# Altium footprint library 6-Connectors-4.PcbLib: 166 footprints (part 4 of 12) (continued)
## MOLEX_87832-1420 [mm] "Milli-Grid, Pitch 2mm, 14 contacts, Surface Mount Vertical Header With Locking Window And Centre Polarization Slot"
height 6.4
pads (16):
  rect 1x2.75 smd: 1(-6,-2.125) 2(-6,2.125) 3(-4,-2.125) 4(-4,2.125) 5(-2,-2.125) 6(-2,2.125) 7(0,-2.125) 8(0,2.125) 9(2,-2.125) 10(2,2.125) 11(4,-2.125) 12(4,2.125) 13(6,-2.125) 14(6,2.125)
  round 0.5 hole 1 unplated: 15(-5,0) 16(5,0)
Top Overlay:
  lines w0.2: -8.325,-1.5 -7.675,-1.5 ; -8.325,0.5 -7.675,0.5 ; -6.8,-3.15 -8.325,-3.15 ; -6.8,-2.5 -7.675,-2.5 ; -6.8,2.5 -7.675,2.5 ; -6.8,3.15 -8.325,3.15 ; 6.8,-3.15 8.325,-3.15 ; 6.8,-2.5 7.675,-2.5 ; 6.8,2.5 7.675,2.5 ; 6.8,3.15 8.325,3.15 ; 7.675,-0.5 8.325,-0.5 ; 7.675,1.5 8.325,1.5 ; -8.325,-3.15 -7.675,-2.5 ; -8.325,-3.15 -8.325,3.15 ; -8.325,3.15 -7.675,2.5 ; -7.675,-2.5 -7.675,2.5 ; 7.675,-2.5 7.675,2.5 ; 7.675,-2.5 8.325,-3.15 ; 7.675,-2.5 8.325,-3.15 ; 7.675,2.5 8.325,3.15 ; 7.675,2.5 8.325,3.15 ; 8.325,-3.15 8.325,3.15 ; -6.5,-4.25 -5.5,-4.25 -6,-3.75 -6.5,-4.25
Mechanical 14:
  lines w0.1: -8.325,-1.5 -7.675,-1.5 ; -8.325,0.5 -7.675,0.5 ; 7.675,-0.5 8.325,-0.5 ; 7.675,1.5 8.325,1.5 ; -8.325,-3.15 -8.325,3.15 ; -8.325,-3.15 -7.675,-2.5 ; -8.325,-3.15 8.325,-3.15 ; -8.325,3.15 -7.675,2.5 ; -8.325,3.15 8.325,3.15 ; -7.675,-2.5 7.675,-2.5 ; -7.675,-2.5 -7.675,2.5 ; -7.675,2.5 7.675,2.5 ; 7.675,-2.5 8.325,-3.15 ; 7.675,-2.5 8.325,-3.15 ; 7.675,-2.5 7.675,2.5 ; 7.675,2.5 8.325,3.15 ; 7.675,2.5 8.325,3.15 ; 8.325,-3.15 8.325,3.15 ; -6.5,-4.25 -6,-3.75 -5.5,-4.25 -6.5,-4.25
Mechanical 15:
  lines w0.05: -8.575,-3.765 8.575,-3.765 8.575,3.765 -8.575,3.765 -8.575,-3.765
3D body "MOLEX_87832-1420.stp": height 7.6, standoff -1, extent -8.325,-3.15 8.325,3.15
3D body "p275-100.stp": height 0.02, standoff 0, extent -6.5,0.75 -5.5,3.5
3D body "p275-100.stp": height 0.02, standoff 0, extent -4.5,0.75 -3.5,3.5
3D body "p275-100.stp": height 0.02, standoff 0, extent -2.5,0.75 -1.5,3.5
3D body "p275-100.stp": height 0.02, standoff 0, extent -6.5,-3.5 -5.5,-0.75
3D body "p275-100.stp": height 0.02, standoff 0, extent -4.5,-3.5 -3.5,-0.75
3D body "p275-100.stp": height 0.02, standoff 0, extent -4.5,0.75 -3.5,3.5
3D body "p275-100.stp": height 0.02, standoff 0, extent -2.5,-3.5 -1.5,-0.75
3D body "p275-100.stp": height 0.02, standoff 0, extent -2.5,0.75 -1.5,3.5
3D body "p275-100.stp": height 0.02, standoff 0, extent -0.5,-3.5 0.5,-0.75
3D body "p275-100.stp": height 0.02, standoff 0, extent -0.5,0.75 0.5,3.5
3D body "p275-100.stp": height 0.02, standoff 0, extent 1.5,-3.5 2.5,-0.75
3D body "p275-100.stp": height 0.02, standoff 0, extent 1.5,0.75 2.5,3.5
3D body "p275-100.stp": height 0.02, standoff 0, extent 3.5,-3.5 4.5,-0.75
3D body "p275-100.stp": height 0.02, standoff 0, extent 3.5,0.75 4.5,3.5
3D body "p275-100.stp": height 0.02, standoff 0, extent 5.5,-3.5 6.5,-0.75
3D body "p275-100.stp": height 0.02, standoff 0, extent 5.5,0.75 6.5,3.5

## MOLEX_87833-1420 [mm] "2.00mm (.079\") Pitch Milli-Grid?Header, Right Angle, Shrouded, Center Polarization Slot, Locking Window, 14 Circuits"
height 6.4
pads (14):
  round 1.6 hole 0.9: 1(-6,-1) 2(-6,1) 3(-4,-1) 4(-4,1) 5(-2,-1) 6(-2,1) 7(0,-1) 8(0,1) 9(2,-1) 10(2,1) 11(4,-1) 12(4,1) 13(6,-1) 14(6,1)
Top Overlay:
  lines w0.2: -7.5,2.7 -7.5,1 -7.1,1 ; -6.325,7.4 -5.825,6.534 -5.325,7.4 ; -5.5,2.7 -5.3,5.3 -4.95,5.3 -4.95,4.7 -3.05,4.7 -3.05,5.3 -2.7,5.3 -2.5,2.7 ; -1.8,7.4 cw(c-1.8,6.8) -1.2,6.8 -1.2,3.65 1.2,3.65 1.2,6.8 cw(c1.8,6.8) 1.8,7.4 ; -0.25,3.65 -0.25,6.65 ; 0.25,3.65 0.25,6.65 ; 2.5,2.7 2.7,5.3 3.05,5.3 3.05,4.7 4.95,4.7 4.95,5.3 5.3,5.3 5.5,2.7 ; 7.1,1 7.5,1 7.5,2.7 ; -0.25,6.65 0.25,6.65 ; -0.25,6.65 -0.1,7.25 0.1,7.25 0.25,6.65 ; -8.325,2.7 8.325,2.7 8.325,7.4 -8.325,7.4 -8.325,2.7
Mechanical 8:
  lines w0.1: -6.5,-1 -6,-1 ; -6.5,1 -6,1 ; -6,-0.5 -6,-1 ; -6,0.5 -6,1 ; -6,1.5 -6,1 ; -5.5,-1 -6,-1 ; -5.5,1 -6,1 ; -4.5,-1 -4,-1 ; -4.5,1 -4,1 ; -4,-0.5 -4,-1 ; -4,0.5 -4,1 ; -4,1.5 -4,1 ; -3.5,-1 -4,-1 ; -3.5,1 -4,1 ; -2.5,-1 -2,-1 ; -2.5,1 -2,1 ; -2,-0.5 -2,-1 ; -2,0.5 -2,1 ; -2,1.5 -2,1 ; -1.5,-1 -2,-1 ; -1.5,1 -2,1 ; -0.5,-1 0,-1 ; -0.5,1 0,1 ; 0,-0.5 0,-1 ; 0,0.5 0,1 ; 0,1.5 0,1 ; 0.5,-1 0,-1 ; 0.5,1 0,1 ; 1.5,-1 2,-1 ; 1.5,1 2,1 ; 2,-0.5 2,-1 ; 2,0.5 2,1 ; 2,1.5 2,1 ; 2.5,-1 2,-1 ; 2.5,1 2,1 ; 3.5,-1 4,-1 ; 3.5,1 4,1 ; 4,-0.5 4,-1 ; 4,0.5 4,1 ; 4,1.5 4,1 ; 4.5,-1 4,-1 ; 4.5,1 4,1 ; 5.5,-1 6,-1 ; 5.5,1 6,1 ; 6,-0.5 6,-1 ; 6,0.5 6,1 ; 6,1.5 6,1 ; 6.5,-1 6,-1 ; 6.5,1 6,1 ; -6,-1 -6,-1.5 -6,-1 ; -4,-1 -4,-1.5 -4,-1 ; -2,-1 -2,-1.5 -2,-1 ; 0,-1 0,-1.5 0,-1 ; 2,-1 2,-1.5 2,-1 ; 4,-1 4,-1.5 4,-1 ; 6,-1 6,-1.5 6,-1
Mechanical 14:
  lines w0.1: -7.5,2.7 -7.5,1 -6.65,1 -6.65,1.85 -5.35,1.85 -5.35,1 -4.65,1 -4.65,1.85 -3.35,1.85 -3.35,1 -2.65,1 -2.65,1.85 -1.35,1.85 -1.35,1 -0.65,1 -0.65,1.85 0.65,1.85 0.65,1 1.35,1 1.35,1.85 2.65,1.85 2.65,1 3.35,1 3.35,1.85 4.65,1.85 4.65,1 5.35,1 5.35,1.85 6.65,1.85 6.65,1 7.5,1 7.5,2.7 ; -6.65,1.35 -5.35,1.35 ; -6.325,7.4 -5.825,6.534 -5.325,7.4 ; -6.25,1.35 -6.25,-1.25 -5.75,-1.25 -5.75,1.35 ; -5.5,2.7 -5.3,5.3 -4.95,5.3 -4.95,4.7 -3.05,4.7 -3.05,5.3 -2.7,5.3 -2.5,2.7 ; -5.427,3.65 -3.4,3.65 -3.4,4.7 ; -4.65,1.35 -3.35,1.35 ; -4.4,3.65 -4.4,4.7 ; -4.25,1.35 -4.25,-1.25 -3.75,-1.25 -3.75,1.35 ; -4.25,3.65 -4.25,4.7 ; -3.75,3.65 -3.75,4.7 ; -3.6,3.65 -3.6,4.7 ; -2.65,1.35 -1.35,1.35 ; -2.25,1.35 -2.25,-1.25 -1.75,-1.25 -1.75,1.35 ; -1.8,7.4 cw(c-1.8,6.8) -1.2,6.8 -1.2,3.65 1.2,3.65 1.2,6.8 cw(c1.8,6.8) 1.8,7.4 ; -1.255,7.05 -0.4,7.05 -0.4,3.65 ; -0.4,6.8 -0.212,6.8 ; -0.25,1.35 -0.25,-1.25 0.25,-1.25 0.25,1.35 ; -0.25,3.65 -0.25,6.65 ; 0.212,6.8 0.4,6.8 ; 0.25,3.65 0.25,6.65 ; 0.4,3.65 0.4,7.05 1.255,7.05 ; 1.35,1.35 2.65,1.35 ; 1.75,1.35 1.75,-1.25 2.25,-1.25 2.25,1.35 ; 2.5,2.7 2.7,5.3 3.05,5.3 3.05,4.7 4.95,4.7 4.95,5.3 5.3,5.3 5.5,2.7 ; 3.35,1.35 4.65,1.35 ; 3.4,4.7 3.4,3.65 5.427,3.65 ; 3.6,3.65 3.6,4.7 ; 3.75,1.35 3.75,-1.25 4.25,-1.25 4.25,1.35 ; 3.75,3.65 3.75,4.7 ; 4.25,3.65 4.25,4.7 ; 4.4,3.65 4.4,4.7 ; 5.35,1.35 6.65,1.35 ; 5.75,1.35 5.75,-1.25 6.25,-1.25 6.25,1.35 ; -0.25,6.65 0.25,6.65 ; -0.25,6.65 -0.1,7.25 0.1,7.25 0.25,6.65 ; -8.325,2.7 8.325,2.7 8.325,7.4 -8.325,7.4 -8.325,2.7 ; -0.65,1.35 0.65,1.35 -0.65,1.35
3D body "MOLEX_87833-1420.stp": height 6.3, standoff -2.16, extent -8.325,-1.25 8.325,7.4
3D body "v160-080.stp": height 0.02, standoff -1.65, extent -6.8,0.2 -5.2,1.8
3D body "v160-080.stp": height 0.02, standoff -1.65, extent -6.8,-1.8 -5.2,-0.2
3D body "v160-080.stp": height 0.02, standoff -1.65, extent -4.8,0.2 -3.2,1.8
3D body "v160-080.stp": height 0.02, standoff -1.65, extent -4.8,-1.8 -3.2,-0.2
3D body "v160-080.stp": height 0.02, standoff -1.65, extent -2.8,0.2 -1.2,1.8
3D body "v160-080.stp": height 0.02, standoff -1.65, extent -2.8,-1.8 -1.2,-0.2
3D body "v160-080.stp": height 0.02, standoff -1.65, extent -0.8,-1.8 0.8,-0.2
3D body "v160-080.stp": height 0.02, standoff -1.65, extent -0.8,0.2 0.8,1.8
3D body "v160-080.stp": height 0.02, standoff -1.65, extent 1.2,0.2 2.8,1.8
3D body "v160-080.stp": height 0.02, standoff -1.65, extent 1.2,-1.8 2.8,-0.2
3D body "v160-080.stp": height 0.02, standoff -1.65, extent 3.2,-1.8 4.8,-0.2
3D body "v160-080.stp": height 0.02, standoff -1.65, extent 3.2,0.2 4.8,1.8
3D body "v160-080.stp": height 0.02, standoff -1.65, extent 5.2,0.2 6.8,1.8
3D body "v160-080.stp": height 0.02, standoff -1.65, extent 5.2,-1.8 6.8,-0.2

## MOLEX_90121-0772 [mm] "2.54mm (.100\") Pitch, 12 Circuits  Single Row  Right Angle C-Grid III Header"
height 3.6
pads (12):
  round 1.7 hole 1: 1(-13.97,0) 2(-11.43,0) 3(-8.89,0) 4(-6.35,0) 5(-3.81,0) 6(-1.27,0) 7(1.27,0) 8(3.81,0) 9(6.35,0) 10(8.89,0) 11(11.43,0) 12(13.97,0)
Top Overlay:
  circle w0.5: c-15.825,0.85 r0.25
  lines w0.2: -15.117,2.25 -15.117,1.75 ; -15.115,2.25 -15.117,1.75 ; -14.288,1.209 -14.288,2.25 ; -14.288,1.75 -15.117,1.75 ; -14.288,4.25 -14.288,11 -13.653,11 -13.653,4.25 ; -13.653,1.209 -13.653,2.25 ; -13.653,1.75 -12.823,1.75 -12.823,2.25 ; -12.577,2.25 -12.577,1.75 -11.748,1.75 ; -11.748,1.209 -11.748,2.25 ; -11.748,4.25 -11.748,11 -11.113,11 -11.113,4.25 ; -11.113,1.209 -11.113,2.25 ; -11.113,1.75 -10.283,1.75 -10.283,2.25 ; -10.037,2.25 -10.037,1.75 -9.208,1.75 ; -9.208,1.209 -9.208,2.25 ; -9.208,4.25 -9.208,11 -8.573,11 -8.573,4.25 ; -8.573,1.209 -8.573,2.25 ; -8.573,1.75 -7.743,1.75 -7.743,2.25 ; -7.497,2.25 -7.497,1.75 -6.668,1.75 ; -6.668,1.209 -6.668,2.25 ; -6.668,4.25 -6.668,11 -6.033,11 -6.033,4.25 ; -6.033,1.209 -6.033,2.25 ; -6.033,1.75 -5.203,1.75 -5.203,2.25 ; -4.957,2.25 -4.957,1.75 -4.128,1.75 ; -4.128,1.209 -4.128,2.25 ; -4.128,4.25 -4.128,11 -3.493,11 -3.493,4.25 ; -3.493,1.209 -3.493,2.25 ; -3.493,1.75 -2.663,1.75 -2.663,2.25 ; -2.417,2.25 -2.417,1.75 -1.587,1.75 ; -1.587,1.209 -1.587,2.25 ; -1.587,4.25 -1.587,11 -0.953,11 -0.953,4.25 ; -0.953,1.209 -0.953,2.25 ; -0.953,1.75 -0.123,1.75 -0.123,2.25 ; 0.123,2.25 0.123,1.75 0.953,1.75 ; 0.953,1.209 0.953,2.25 ; 0.953,4.25 0.953,11 1.587,11 1.587,4.25 ; 1.587,1.209 1.587,2.25 ; 1.587,1.75 2.417,1.75 2.417,2.25 ; 2.663,2.25 2.663,1.75 3.493,1.75 ; 3.493,1.209 3.493,2.25 ; 3.493,4.25 3.493,11 4.128,11 4.128,4.25 ; 4.128,1.209 4.128,2.25 ; 4.128,1.75 4.957,1.75 4.957,2.25 ; 5.203,2.25 5.203,1.75 6.033,1.75 ; 6.033,1.209 6.033,2.25 ; 6.033,4.25 6.033,11 6.668,11 6.668,4.25 ; 6.668,1.209 6.668,2.25 ; 6.668,1.75 7.497,1.75 7.497,2.25 ; 7.743,2.25 7.743,1.75 8.573,1.75 ; 8.573,1.209 8.573,2.25 ; 8.573,4.25 8.573,11 9.208,11 9.208,4.25 ; 9.208,1.209 9.208,2.25 ; 9.208,1.75 10.037,1.75 10.037,2.25 ; 10.283,2.25 10.283,1.75 11.113,1.75 ; 11.113,1.209 11.113,2.25 ; 11.113,4.25 11.113,11 11.748,11 11.748,4.25 ; 11.748,1.209 11.748,2.25 ; 11.748,1.75 12.577,1.75 12.577,2.25 ; 12.823,2.25 12.823,1.75 13.653,1.75 ; 13.653,1.209 13.653,2.25 ; 13.653,4.25 13.653,11 14.288,11 14.288,4.25 ; 14.288,1.209 14.288,2.25 ; 14.288,1.75 15.12,1.75 ; 15.117,1.75 15.117,2.25 ; -15.24,2.25 -15.24,4.25 15.24,4.25 15.24,2.25 -15.24,2.25
Mechanical 8:
  lines w0.1: -14.47,0 -13.97,0 ; -13.97,-0.5 -13.97,0 ; -13.97,0.5 -13.97,0 ; -13.47,0 -13.97,0 ; -11.93,0 -11.43,0 ; -11.43,-0.5 -11.43,0 ; -11.43,0.5 -11.43,0 ; -10.93,0 -11.43,0 ; -9.39,0 -8.89,0 ; -8.89,-0.5 -8.89,0 ; -8.89,0.5 -8.89,0 ; -8.39,0 -8.89,0 ; -6.85,0 -6.35,0 ; -6.35,-0.5 -6.35,0 ; -6.35,0.5 -6.35,0 ; -5.85,0 -6.35,0 ; -4.31,0 -3.81,0 ; -3.81,-0.5 -3.81,0 ; -3.81,0.5 -3.81,0 ; -3.31,0 -3.81,0 ; -1.77,0 -1.27,0 ; -1.27,-0.5 -1.27,0 ; -1.27,0.5 -1.27,0 ; -0.77,0 -1.27,0 ; -0.5,0 0,0 ; 0,-0.5 0,0 ; 0,0.5 0,0 ; 0.5,0 0,0 ; 0.77,0 1.27,0 ; 1.27,-0.5 1.27,0 ; 1.27,0.5 1.27,0 ; 1.77,0 1.27,0 ; 3.31,0 3.81,0 ; 3.81,-0.5 3.81,0 ; 3.81,0.5 3.81,0 ; 4.31,0 3.81,0 ; 5.85,0 6.35,0 ; 6.35,-0.5 6.35,0 ; 6.35,0.5 6.35,0 ; 6.85,0 6.35,0 ; 8.39,0 8.89,0 ; 8.89,-0.5 8.89,0 ; 8.89,0.5 8.89,0 ; 9.39,0 8.89,0 ; 10.93,0 11.43,0 ; 11.43,-0.5 11.43,0 ; 11.43,0.5 11.43,0 ; 11.93,0 11.43,0 ; 13.47,0 13.97,0 ; 13.97,-0.5 13.97,0 ; 13.97,0.5 13.97,0 ; 14.47,0 13.97,0
Mechanical 14:
  circle w0.5: c-15.825,0.85 r0.25
  lines w0.1: -15.117,2.25 -15.117,1.75 ; -15.115,2.25 -15.117,1.75 ; -14.288,1.75 -15.117,1.75 ; -14.288,2.25 -14.288,-0.318 -13.653,-0.318 -13.653,2.25 ; -14.288,4.25 -14.288,11 -13.653,11 -13.653,4.25 ; -13.653,1.75 -12.823,1.75 -12.823,2.25 ; -12.577,2.25 -12.577,1.75 -11.748,1.75 ; -11.748,2.25 -11.748,-0.318 -11.113,-0.318 -11.113,2.25 ; -11.748,4.25 -11.748,11 -11.113,11 -11.113,4.25 ; -11.113,1.75 -10.283,1.75 -10.283,2.25 ; -10.037,2.25 -10.037,1.75 -9.208,1.75 ; -9.208,2.25 -9.208,-0.318 -8.573,-0.318 -8.573,2.25 ; -9.208,4.25 -9.208,11 -8.573,11 -8.573,4.25 ; -8.573,1.75 -7.743,1.75 -7.743,2.25 ; -7.497,2.25 -7.497,1.75 -6.668,1.75 ; -6.668,2.25 -6.668,-0.318 -6.033,-0.318 -6.033,2.25 ; -6.668,4.25 -6.668,11 -6.033,11 -6.033,4.25 ; -6.033,1.75 -5.203,1.75 -5.203,2.25 ; -4.957,2.25 -4.957,1.75 -4.128,1.75 ; -4.128,2.25 -4.128,-0.318 -3.493,-0.318 -3.493,2.25 ; -4.128,4.25 -4.128,11 -3.493,11 -3.493,4.25 ; -3.493,1.75 -2.663,1.75 -2.663,2.25 ; -2.417,2.25 -2.417,1.75 -1.587,1.75 ; -1.587,2.25 -1.587,-0.318 -0.953,-0.318 -0.953,2.25 ; -1.587,4.25 -1.587,11 -0.953,11 -0.953,4.25 ; -0.953,1.75 -0.123,1.75 -0.123,2.25 ; 0.123,2.25 0.123,1.75 0.953,1.75 ; 0.953,2.25 0.953,-0.318 1.587,-0.318 1.587,2.25 ; 0.953,4.25 0.953,11 1.587,11 1.587,4.25 ; 1.587,1.75 2.417,1.75 2.417,2.25 ; 2.663,2.25 2.663,1.75 3.493,1.75 ; 3.493,2.25 3.493,-0.318 4.128,-0.318 4.128,2.25 ; 3.493,4.25 3.493,11 4.128,11 4.128,4.25 ; 4.128,1.75 4.957,1.75 4.957,2.25 ; 5.203,2.25 5.203,1.75 6.033,1.75 ; 6.033,2.25 6.033,-0.318 6.668,-0.318 6.668,2.25 ; 6.033,4.25 6.033,11 6.668,11 6.668,4.25 ; 6.668,1.75 7.497,1.75 7.497,2.25 ; 7.743,2.25 7.743,1.75 8.573,1.75 ; 8.573,2.25 8.573,-0.318 9.208,-0.318 9.208,2.25 ; 8.573,4.25 8.573,11 9.208,11 9.208,4.25 ; 9.208,1.75 10.037,1.75 10.037,2.25 ; 10.283,2.25 10.283,1.75 11.113,1.75 ; 11.113,2.25 11.113,-0.318 11.748,-0.318 11.748,2.25 ; 11.113,4.25 11.113,11 11.748,11 11.748,4.25 ; 11.748,1.75 12.577,1.75 12.577,2.25 ; 12.823,2.25 12.823,1.75 13.653,1.75 ; 13.653,2.25 13.653,-0.318 14.288,-0.318 14.288,2.25 ; 13.653,4.25 13.653,11 14.288,11 14.288,4.25 ; 14.288,1.75 15.12,1.75 ; 15.117,1.75 15.117,2.25 ; -15.24,2.25 -15.24,4.25 15.24,4.25 15.24,2.25 -15.24,2.25
3D body "MOLEX_90121-0772.stp": height 3.6, standoff -2.9, extent -15.24,-0.317 15.24,11
3D body "v160-080.stp": height 0.02, standoff -1.65, extent -14.77,-0.8 -13.17,0.8
3D body "v160-080.stp": height 0.02, standoff -1.65, extent -12.23,-0.8 -10.63,0.8
3D body "v160-080.stp": height 0.02, standoff -1.65, extent -9.69,-0.8 -8.09,0.8
3D body "v160-080.stp": height 0.02, standoff -1.65, extent -7.15,-0.8 -5.55,0.8
3D body "v160-080.stp": height 0.02, standoff -1.65, extent -4.61,-0.8 -3.01,0.8
3D body "v160-080.stp": height 0.02, standoff -1.65, extent -2.07,-0.8 -0.47,0.8
3D body "v160-080.stp": height 0.02, standoff -1.65, extent 0.47,-0.8 2.07,0.8
3D body "v160-080.stp": height 0.02, standoff -1.65, extent 3.01,-0.8 4.61,0.8
3D body "v160-080.stp": height 0.02, standoff -1.65, extent 5.55,-0.8 7.15,0.8
3D body "v160-080.stp": height 0.02, standoff -1.65, extent 8.09,-0.8 9.69,0.8
3D body "v160-080.stp": height 0.02, standoff -1.65, extent 10.63,-0.8 12.23,0.8
3D body "v160-080.stp": height 0.02, standoff -1.65, extent 13.17,-0.8 14.77,0.8

## MOLEX_90136-1206 [mm] "2.54mm (.100\") Pitch C-Grid III Header, Single Row, Vertical, Shrouded, 6 Circuits"
height 11.1
pads (6):
  round 1.7 hole 1: 1(-6.35,0) 2(-3.81,0) 3(-1.27,0) 4(1.27,0) 5(3.81,0) 6(6.35,0)
Top Overlay:
  lines w0.2: -6.667,-3.15 -6.35,-2.515 -6.032,-3.15 ; -9.295,-3.607 -9.295,3.124 -2.766,3.124 -2.591,3.607 2.591,3.607 2.766,3.124 9.295,3.124 9.295,-3.607 8.787,-3.607 8.786,-3.15 0.458,-3.148 0.457,-3.607 -0.457,-3.607 -0.457,-3.15 -8.787,-3.15 -8.787,-3.607 -9.295,-3.607 ; -8.344,-1.994 8.344,-1.994 8.344,1.968 2.23,1.968 1.984,3.365 -1.984,3.365 -2.23,1.968 -8.344,1.968 -8.344,-1.994
Mechanical 14:
  lines w0.1: -6.667,-3.15 -6.35,-2.515 -6.032,-3.15 ; -9.295,-3.607 -9.295,3.124 -2.766,3.124 -2.591,3.607 2.591,3.607 2.766,3.124 9.295,3.124 9.295,-3.607 8.787,-3.607 8.786,-3.15 0.458,-3.148 0.457,-3.607 -0.457,-3.607 -0.457,-3.15 -8.787,-3.15 -8.787,-3.607 -9.295,-3.607 ; -8.344,-1.994 8.344,-1.994 8.344,1.968 2.23,1.968 1.984,3.365 -1.984,3.365 -2.23,1.968 -8.344,1.968 -8.344,-1.994
3D body "MOLEX_901361206.stp": height 10.9, standoff -2.9, extent -9.485,-3.605 9.485,3.605

## MOLEX_90136-1212 [mm] "2.54mm (.100\") Pitch C-Grid III Header, Single Row, Vertical, Shrouded, 12 Circuits"
height 11.1
pads (12):
  round 1.7 hole 1: 1(-13.97,0) 2(-11.43,0) 3(-8.89,0) 4(-6.35,0) 5(-3.81,0) 6(-1.27,0) 7(1.27,0) 8(3.81,0) 9(6.35,0) 10(8.89,0) 11(11.43,0) 12(13.97,0)
Top Overlay:
  lines w0.2: -16,-1.5 16,-1.5 ; -16,1.5 16,1.5 ; -14.21,-2.825 -13.892,-2.19 -13.575,-2.825 ; -2.023,1.915 -1.908,3.235 1.908,3.235 2.023,1.915 ; -2.005,2.115 -16.2,2.115 ; -1.925,3.035 1.925,3.035 ; 2.005,2.115 16.2,2.115 ; -16.2,-2.115 16.2,-2.115 ; -16.2,-2.115 -16.2,2.115 ; -16.2,-2.115 -16,-1.915 ; -16.2,2.115 -16,1.915 ; -16,-1.915 16,-1.915 ; -16,-1.915 -16,1.915 ; -16,1.915 16,1.915 ; 16,-1.915 16,1.915 ; 16,-1.915 16.2,-2.115 ; 16,1.915 16.2,2.115 ; 16.2,-2.115 16.2,2.115 ; -16.915,-3.605 -16.015,-3.605 -16.015,-2.975 cw(c-15.865,-2.975) -15.865,-2.825 -1.05,-2.825 cw(c-1.05,-2.975) -0.9,-2.975 -0.9,-3.605 0.9,-3.605 0.9,-2.975 cw(c1.05,-2.975) 1.05,-2.825 15.865,-2.825 cw(c15.865,-2.975) 16.015,-2.975 16.015,-3.605 16.915,-3.605 16.915,2.825 2.869,2.825 2.585,3.605 -2.585,3.605 -2.869,2.825 -16.915,2.825 -16.915,-3.605
Mechanical 8:
  lines w0.1: -14.47,0 -13.97,0 ; -13.97,-0.5 -13.97,0 ; -13.97,0.5 -13.97,0 ; -13.47,0 -13.97,0 ; -11.93,0 -11.43,0 ; -11.43,-0.5 -11.43,0 ; -11.43,0.5 -11.43,0 ; -10.93,0 -11.43,0 ; -9.39,0 -8.89,0 ; -8.89,-0.5 -8.89,0 ; -8.89,0.5 -8.89,0 ; -8.39,0 -8.89,0 ; -6.85,0 -6.35,0 ; -6.35,-0.5 -6.35,0 ; -6.35,0.5 -6.35,0 ; -5.85,0 -6.35,0 ; -4.31,0 -3.81,0 ; -3.81,-0.5 -3.81,0 ; -3.81,0.5 -3.81,0 ; -3.31,0 -3.81,0 ; -1.77,0 -1.27,0 ; -1.27,-0.5 -1.27,0 ; -1.27,0.5 -1.27,0 ; -0.77,0 -1.27,0 ; -0.5,0 0,0 ; 0,-0.5 0,0 ; 0,0.5 0,0 ; 0.5,0 0,0 ; 0.77,0 1.27,0 ; 1.27,-0.5 1.27,0 ; 1.27,0.5 1.27,0 ; 1.77,0 1.27,0 ; 3.31,0 3.81,0 ; 3.81,-0.5 3.81,0 ; 3.81,0.5 3.81,0 ; 4.31,0 3.81,0 ; 5.85,0 6.35,0 ; 6.35,-0.5 6.35,0 ; 6.35,0.5 6.35,0 ; 6.85,0 6.35,0 ; 8.39,0 8.89,0 ; 8.89,-0.5 8.89,0 ; 8.89,0.5 8.89,0 ; 9.39,0 8.89,0 ; 10.93,0 11.43,0 ; 11.43,-0.5 11.43,0 ; 11.43,0.5 11.43,0 ; 11.93,0 11.43,0 ; 13.47,0 13.97,0 ; 13.97,-0.5 13.97,0 ; 13.97,0.5 13.97,0 ; 14.47,0 13.97,0
Mechanical 14:
  lines w0.1: -16,-1.5 16,-1.5 ; -16,1.5 16,1.5 ; -14.21,-2.825 -13.892,-2.19 -13.575,-2.825 ; -2.023,1.915 -1.908,3.235 1.908,3.235 2.023,1.915 ; -2.005,2.115 -16.2,2.115 ; -1.925,3.035 1.925,3.035 ; 2.005,2.115 16.2,2.115 ; -16.2,-2.115 16.2,-2.115 ; -16.2,-2.115 -16.2,2.115 ; -16.2,-2.115 -16,-1.915 ; -16.2,2.115 -16,1.915 ; -16,-1.915 16,-1.915 ; -16,-1.915 -16,1.915 ; -16,1.915 16,1.915 ; 16,-1.915 16,1.915 ; 16,-1.915 16.2,-2.115 ; 16,1.915 16.2,2.115 ; 16.2,-2.115 16.2,2.115 ; -16.915,-3.605 -16.015,-3.605 -16.015,-2.975 cw(c-15.865,-2.975) -15.865,-2.825 -1.05,-2.825 cw(c-1.05,-2.975) -0.9,-2.975 -0.9,-3.605 0.9,-3.605 0.9,-2.975 cw(c1.05,-2.975) 1.05,-2.825 15.865,-2.825 cw(c15.865,-2.975) 16.015,-2.975 16.015,-3.605 16.915,-3.605 16.915,2.825 2.869,2.825 2.585,3.605 -2.585,3.605 -2.869,2.825 -16.915,2.825 -16.915,-3.605
3D body "MOLEX_90136-1212.stp": height 10.9, standoff -2.9, extent -16.915,-3.605 16.915,3.605

## MOLEX_500075-1517 [mm] "Straight, USB Serie Mini-B Type 2 Through Hole Receptacle"
height 7.7
pads (7):
  round 1.25 hole 0.7: 1(1.6,1.3) 2(0.8,-1.3) 3(0,1.3) 4(-0.8,-1.3) 5(-1.6,1.3)
  oval 1.4x3.9 hole 0.7 slot 2.4 at 90 deg: 6(-3.65,0) 6(3.65,0)
Top Overlay:
  lines w0.2: -3.322,2.3 3.322,2.3 ; -2.9,-2.055 -2.9,-2.4 -2.25,-2.4 -2.25,-1.9 ; -2.763,-1.9 -1.6,-1.9 ; -2.189,0.492 -2.3,0.3 -2.3,-0.3 -2.2,-0.4 -1.236,-0.4 ; -0.364,-0.4 0.364,-0.4 ; 1.236,-0.4 2.2,-0.4 ; 1.6,-1.9 2.763,-1.9 ; 2.189,0.492 2.3,0.3 2.3,-0.3 ; 2.25,-1.9 2.25,-2.4 2.9,-2.4 2.9,-2.055 ; 2.2,-0.4 2.3,-0.3 ; 2.2,-0.4 2.3,-0.3 ; -1.825,-0.1 -1.825,0.5 -1.425,0.5 -1.425,-0.1 -1.825,-0.1 ; -1,-0.1 -1,0.5 -0.6,0.5 -0.6,-0.1 -1,-0.1 ; -0.225,-0.1 -0.225,0.5 0.175,0.5 0.175,-0.1 -0.225,-0.1 ; 0.6,-0.1 0.6,0.5 1,0.5 1,-0.1 0.6,-0.1 ; 1.4,-0.1 1.4,0.5 1.8,0.5 1.8,-0.1 1.4,-0.1
Mechanical 8:
  lines w0.1: -4.15,0 -3.65,0 ; -3.65,-0.5 -3.65,0 ; -3.65,0.5 -3.65,0 ; -3.15,0 -3.65,0 ; -2.1,1.3 -1.6,1.3 ; -1.6,0.8 -1.6,1.3 ; -1.6,1.8 -1.6,1.3 ; -1.3,-1.3 -0.8,-1.3 ; -1.1,1.3 -1.6,1.3 ; -0.8,-1.8 -0.8,-1.3 ; -0.8,-0.8 -0.8,-1.3 ; -0.5,0 0,0 ; -0.5,1.3 0,1.3 ; -0.3,-1.3 -0.8,-1.3 ; 0,-0.5 0,0 ; 0,0.5 0,0 ; 0,0.8 0,1.3 ; 0,1.8 0,1.3 ; 0.3,-1.3 0.8,-1.3 ; 0.5,0 0,0 ; 0.5,1.3 0,1.3 ; 0.8,-1.8 0.8,-1.3 ; 0.8,-0.8 0.8,-1.3 ; 1.1,1.3 1.6,1.3 ; 1.3,-1.3 0.8,-1.3 ; 1.6,0.8 1.6,1.3 ; 1.6,1.8 1.6,1.3 ; 2.1,1.3 1.6,1.3 ; 3.15,0 3.65,0 ; 3.65,-0.5 3.65,0 ; 3.65,0.5 3.65,0 ; 4.15,0 3.65,0 ; -4.35,-1.25 ccw(c-3.65,-1.25) -2.95,-1.25 -2.95,1.25 ccw(c-3.65,1.25) -4.35,1.25 -4.35,-1.25 ; -3.975,-0.875 ccw(c-3.65,-0.875) -3.325,-0.875 -3.325,0.875 ccw(c-3.65,0.875) -3.975,0.875 -3.975,-0.875 ; 2.95,-1.25 ccw(c3.65,-1.25) 4.35,-1.25 4.35,1.25 ccw(c3.65,1.25) 2.95,1.25 2.95,-1.25 ; 3.325,-0.875 ccw(c3.65,-0.875) 3.975,-0.875 3.975,0.875 ccw(c3.65,0.875) 3.325,0.875 3.325,-0.875
Mechanical 14:
  lines w0.1: -3.45,0.288 -3.45,2.3 3.45,2.3 3.45,0.288 ; -3.45,2.05 -3.55,2.05 ccw(c-3.55,1.75) -3.85,1.75 -3.85,-0.403 ; -2.9,-1.9 -2.9,-2.4 -2.25,-2.4 -2.25,-1.9 ; 2.25,-1.9 2.25,-2.4 2.9,-2.4 2.9,-1.9 ; 3.45,2.05 3.55,2.05 cw(c3.55,1.75) 3.85,1.75 3.85,-0.403 ; -3.85,-0.403 cw(c-3.15,-0.403) -3.647,0.089 -3.422,0.317 ccw(c-3.635,0.528) -3.335,0.528 -3.335,1.3 cw(c-2.635,1.3) -2.635,2 2.635,2 cw(c2.635,1.3) 3.335,1.3 3.335,0.528 ccw(c3.635,0.528) 3.422,0.317 3.647,0.089 cw(c3.15,-0.403) 3.85,-0.403 ; -3.85,-0.403 -3.85,-1.2 ccw(c-3.15,-1.2) -3.15,-1.9 3.15,-1.9 ccw(c3.15,-1.2) 3.85,-1.2 3.85,-0.403 ; 2.2,-0.4 2.3,-0.3 ; 2.2,-0.4 -2.2,-0.4 -2.3,-0.3 -2.3,0.3 -1.838,1.1 -1.318,1.1 -1.118,0.9 1.118,0.9 1.318,1.1 1.838,1.1 2.3,0.3 2.3,-0.3 ; 2.2,-0.4 2.3,-0.3 ; -3.45,-1.2 ccw(c-3.15,-1.2) -3.15,-1.5 3.15,-1.5 ccw(c3.15,-1.2) 3.45,-1.2 3.45,-0.403 ccw(c3.15,-0.403) 3.363,-0.192 3.138,0.035 cw(c3.635,0.528) 2.935,0.528 2.935,1.3 ccw(c2.635,1.3) 2.635,1.6 -2.635,1.6 ccw(c-2.635,1.3) -2.935,1.3 -2.935,0.528 cw(c-3.635,0.528) -3.138,0.035 -3.363,-0.192 ccw(c-3.15,-0.403) -3.45,-0.403 -3.45,-1.2 ; -1.825,-0.1 -1.825,0.5 -1.425,0.5 -1.425,-0.1 -1.825,-0.1 ; -1,-0.1 -1,0.5 -0.6,0.5 -0.6,-0.1 -1,-0.1 ; -0.225,-0.1 -0.225,0.5 0.175,0.5 0.175,-0.1 -0.225,-0.1 ; 0.6,-0.1 0.6,0.5 1,0.5 1,-0.1 0.6,-0.1 ; 1.4,-0.1 1.4,0.5 1.8,0.5 1.8,-0.1 1.4,-0.1
3D body "ty390-140.stp": height 0.03, standoff -1.67, extent 2.95,-1.95 4.35,1.95
3D body "ty390-140.stp": height 0.03, standoff -1.67, extent -4.35,-1.95 -2.95,1.95
3D body "MOLEX_500075-1517.stp": height 7.7, standoff -2.1, extent -3.85,-2.4 3.85,2.3

## MTGP720H320V6P [mm]
pads (1):
  round 7.2 hole 3.25: 1(0,0)
via -2.2,-1.35 diameter 1 hole 0.5
via -2.2,1.375 diameter 1 hole 0.5
via 0,2.525 diameter 1 hole 0.5
via 2.2,1.35 diameter 1 hole 0.5
via 0,-2.625 diameter 1 hole 0.5
via 2.2,-1.35 diameter 1 hole 0.5
Mechanical 8:
  circle w0.1: c0,0 r2.6
  circle w0.1: c0,0 r3.75
  lines w0.1: -2.657,1.625 -2.224,1.375 ; -2.632,-1.6 -2.199,-1.35 ; -2.474,0.942 -2.224,1.375 ; -2.449,-0.917 -2.199,-1.35 ; -1.974,1.808 -2.224,1.375 ; -1.949,-1.783 -2.199,-1.35 ; -1.791,1.125 -2.224,1.375 ; -1.766,-1.1 -2.199,-1.35 ; -0.5,-2.625 0,-2.625 ; -0.5,0 0,0 ; -0.5,2.525 0,2.525 ; 0,-3.125 0,-2.625 ; 0,-2.125 0,-2.625 ; 0,-0.5 0,0 ; 0,0.5 0,0 ; 0,2.025 0,2.525 ; 0,3.025 0,2.525 ; 0.5,-2.625 0,-2.625 ; 0.5,0 0,0 ; 0.5,2.525 0,2.525 ; 1.766,-1.1 2.199,-1.35 ; 1.766,1.1 2.199,1.35 ; 1.949,-1.783 2.199,-1.35 ; 1.949,1.783 2.199,1.35 ; 2.449,-0.917 2.199,-1.35 ; 2.449,0.917 2.199,1.35 ; 2.632,-1.6 2.199,-1.35 ; 2.632,1.6 2.199,1.35
Mechanical 14:
  circle w0.1: c0,0 r3.75
Mechanical 15:
  circle w0.05: c0,0 r3.85
3D body "mtgp720h320v6p.stp": height 0.1, standoff -1.75, extent -3.627,-3.627 3.628,3.628

## N2B-2.0 [mm]
height 8.4
pads (2):
  oct 1.5x1.8 hole 0.9: 1(-1,0)
  oval 1.5x1.8 hole 0.9: 2(1,0)
Top Overlay:
  lines w0.15: -2.075,-1.075 -2.075,1.075 2.075,1.075 2.075,-1.075 -2.075,-1.075
Mechanical 10:
  lines w0.15: -2.075,-1.075 -2.075,1.075 2.075,1.075 2.075,-1.075 -2.075,-1.075
Mechanical 15:
  lines w0.15: -2.075,-1.075 -2.075,1.075 2.075,1.075 2.075,-1.075 -2.075,-1.075
3D body "1x2x02.stp": height 5.6, standoff -2.8, extent -2,-1 2,1

## N3B-2.0 [mm]
height 8.4
pads (3):
  oct 1.5x1.8 hole 0.9: 1(-2,0)
  oval 1.5x1.8 hole 0.9: 2(0,0) 3(2,0)
Top Overlay:
  lines w0.15: -3.075,-1.075 3.075,-1.075 3.075,1.075 -3.075,1.075 -3.075,-1.075
Mechanical 10:
  lines w0.15: -3.075,-1.075 3.075,-1.075 3.075,1.075 -3.075,1.075 -3.075,-1.075
Mechanical 15:
  lines w0.15: -3.075,-1.075 3.075,-1.075 3.075,1.075 -3.075,1.075 -3.075,-1.075
3D body "1x2x03.stp": height 5.6, standoff -2.8, extent -3,-1 3,1

## N4B-2.0 [mm]
height 8.4
pads (4):
  oct 1.5x1.8 hole 0.9: 1(-3,0)
  oval 1.5x1.8 hole 0.9: 2(-1,0) 3(1,0) 4(3,0)
Top Overlay:
  lines w0.15: -4.075,-1.075 -4.075,1.075 4.075,1.075 4.075,-1.075 -4.075,-1.075
Mechanical 10:
  lines w0.15: -4.075,-1.075 -4.075,1.075 4.075,1.075 4.075,-1.075 -4.075,-1.075
Mechanical 15:
  lines w0.15: -4.075,-1.075 -4.075,1.075 4.075,1.075 4.075,-1.075 -4.075,-1.075
3D body "1x2x04.stp": height 5.6, standoff -2.8, extent -4,-1 4,1